# Altium integrated library vh_altium_library.intLib: 963 symbols (part 3 of 5)
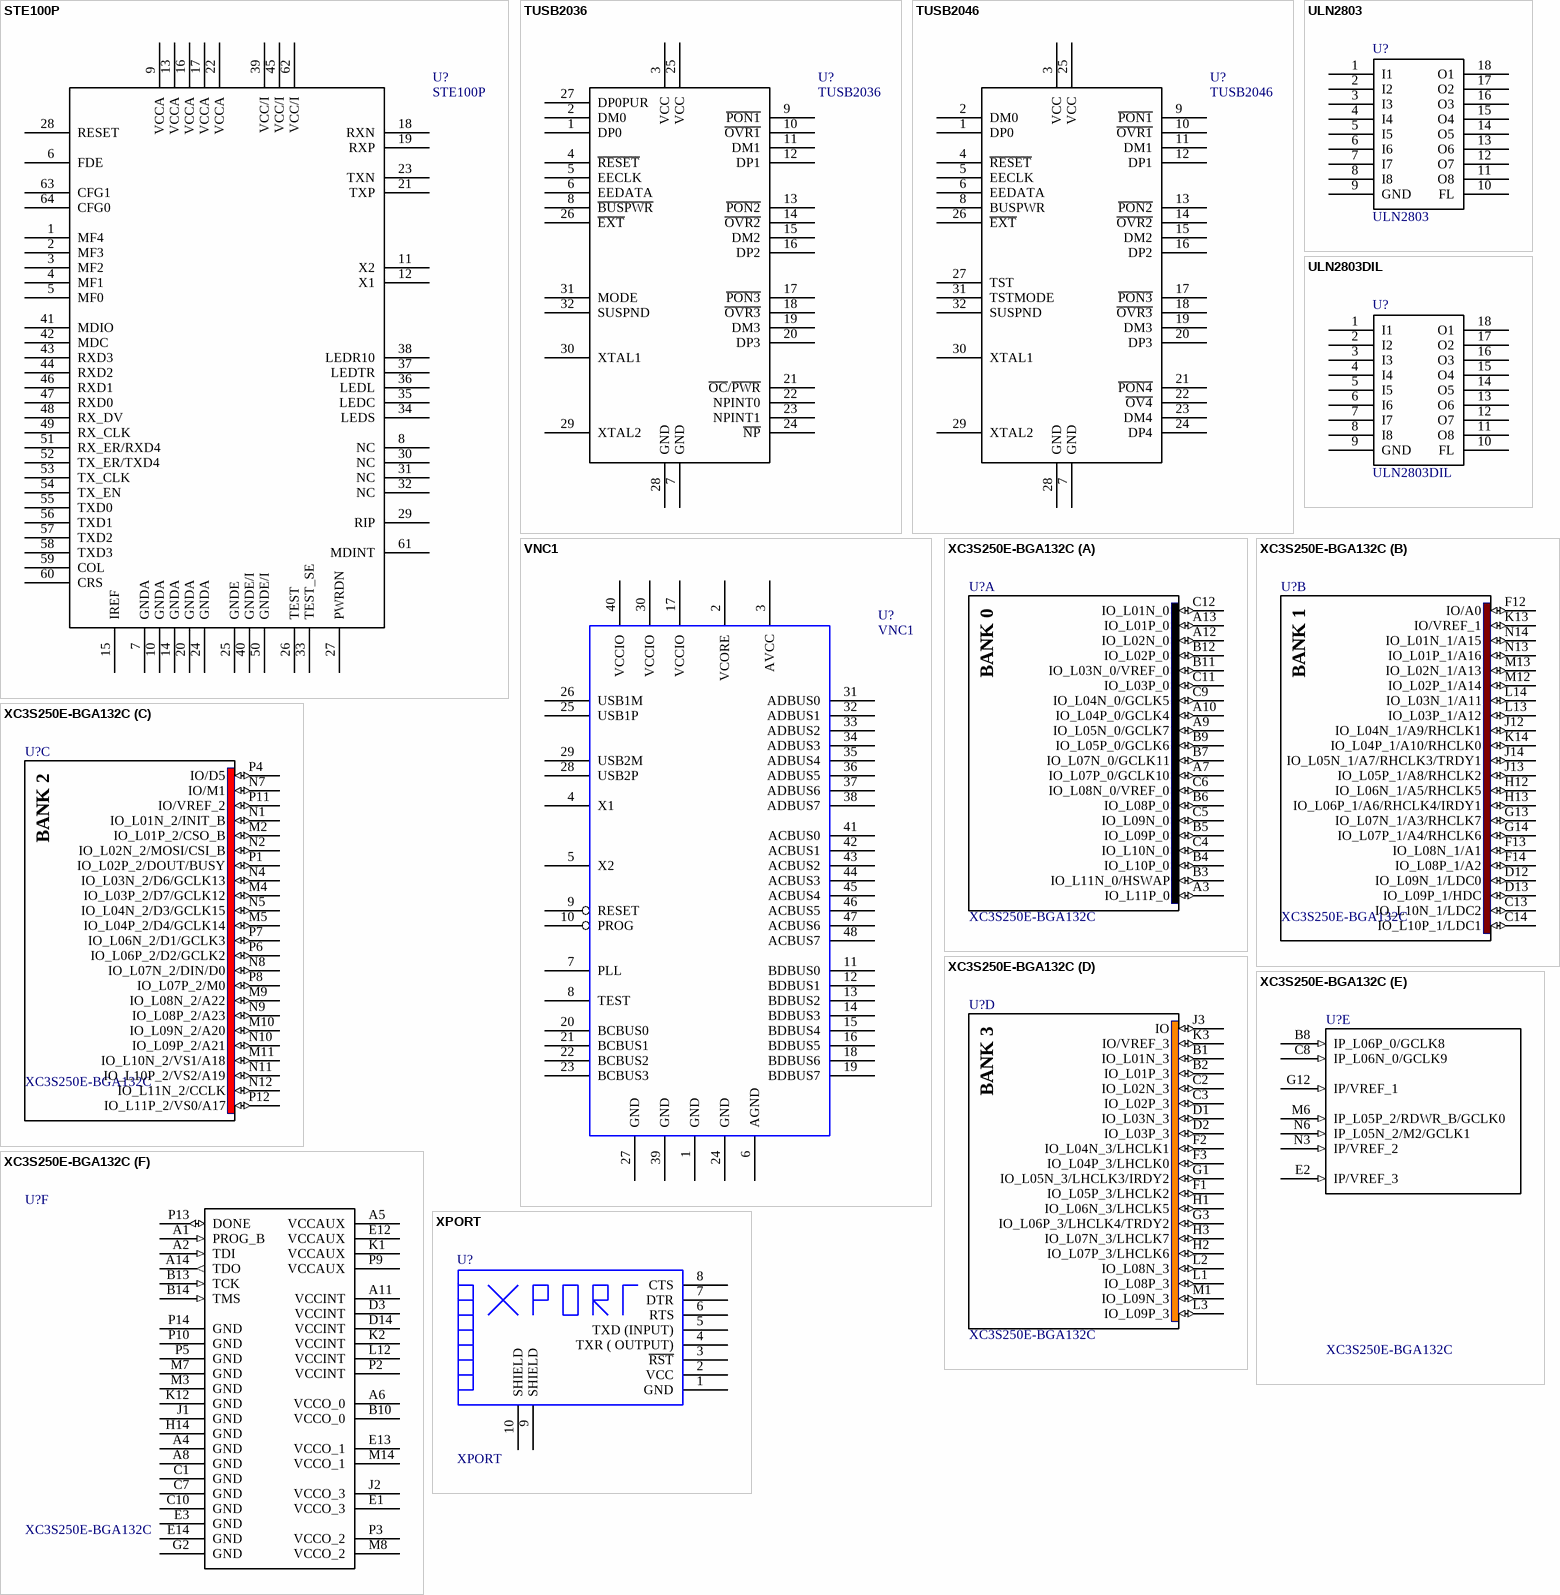
[diagram p70: symbols STE100P to XPORT]

## ULN2803
designator U?
OCTAL HIGH CURRENT DRIVER; Manufacturer: Texas Instruments; Manufacturer Part Number: ULN2803ADWR; Number of Drivers/Receivers: 8/0; Description: IC DARL TRANS ARRAY HV 18-SOIC; Voltage - Supply: 5V; Supplier 1: Digi-Key; Supplier Part Number 1: 296-15777-1-ND; Packaging: Cut Tape (CT); Supplier Part Number: 296-15777-1-ND; Type: Darlington Array; Supplier: Digi-Key; Protocol: -; Package / Case: 18-SOIC (7.5mm Width); Category: Integrated Circuits (ICs); RoHS: RoHS Compliant
footprint SO18W
pins: 1 I1, 2 I2, 3 I3, 4 I4, 5 I5, 6 I6, 7 I7, 8 I8, 9 GND, 10 FL, 11 O8, 12 O7, 13 O6, 14 O5, 15 O4, 16 O3, 17 O2, 18 O1

## ULN2803DIL
designator U?
OCTAL HIGH CURRENT DRIVER; Manufacturer: Texas Instruments; Manufacturer Part Number: ULN2803ADWR; Number of Drivers/Receivers: 8/0; Description: IC DARL TRANS ARRAY HV 18-SOIC; Voltage - Supply: 5V; Supplier 1: Digi-Key; Supplier Part Number 1: 296-15777-1-ND; Packaging: Cut Tape (CT); Supplier Part Number: 296-15777-1-ND; Type: Darlington Array; Supplier: Digi-Key; Protocol: -; Package / Case: 18-SOIC (7.5mm Width); Category: Integrated Circuits (ICs); RoHS: RoHS Compliant
footprint DIP18
pins: 1 I1, 2 I2, 3 I3, 4 I4, 5 I5, 6 I6, 7 I7, 8 I8, 9 GND, 10 FL, 11 O8, 12 O7, 13 O6, 14 O5, 15 O4, 16 O3, 17 O2, 18 O1

## VNC1
designator U?
VINCULUM USB HOST CONTROLLER; Manufacturer Part Number: VNC1L-1A-REEL; Manufacturer: FTDI, Future Technology Devices International Ltd; Description: IC USB HOST CTLR VINCULUM 48LQFP; Current - Supply: 25mA; Interface: SPI; Voltage - Supply: 3 V ~ 3.6 V; Controller Type: USB 2.0 Controller; Supplier 1: Digi-Key; Supplier Part Number 1: 768-1000-2-ND; Supplier Part Number: 768-1000-2-ND; RoHS: RoHS Compliant; Supplier: Digi-Key; Category: Integrated Circuits (ICs); Operating Temperature: 0°C ~ 70°C; Packaging: Tape & Reel (TR); Package / Case: 48-LQFP
footprint TQFP48
pins: 1 GND, 2 VCORE, 3 AVCC, 4 X1, 5 X2, 6 AGND, 7 PLL, 8 TEST, 9 RESET, 10 PROG, 11 BDBUS0, 12 BDBUS1, 13 BDBUS2, 14 BDBUS3, 15 BDBUS4, 16 BDBUS5, 17 VCCIO, 18 BDBUS6, 19 BDBUS7, 20 BCBUS0, 21 BCBUS1, 22 BCBUS2, 23 BCBUS3, 24 GND, 25 USB1P, 26 USB1M, 27 GND, 28 USB2P, 29 USB2M, 30 VCCIO, 31 ADBUS0, 32 ADBUS1, 33 ADBUS2, 34 ADBUS3, 35 ADBUS4, 36 ADBUS5, 37 ADBUS6, 38 ADBUS7, 39 GND, 40 VCCIO, 41 ACBUS0, 42 ACBUS1, 43 ACBUS2, 44 ACBUS3, 45 ACBUS4, 46 ACBUS5, 47 ACBUS6, 48 ACBUS7

## XC3S250E-BGA132C
designator U?
Spartan-3E 1.2V FPGA, 92 User I/Os, 132-Ball Chip-Scale BGA, Standard Performance, Commercial Grade, Pb-Free; FirstPublished: 6-Jun-2005; LatestRevisionDate: 30-Oct-2009; LatestRevisionNote: Updated to datasheet version 3.8 Aug-2009.; DatasheetVersion: ver3.8, Aug-2009; PackageVersion: ver1.3, Jun-2008; PackageReference: CPG132; Publisher: Altium Limited; PackageDescription: 132-Ball Chip Scale Ball Grid Array 0.5 mm Pitch (CPG132) - Pb-Free; Supplier 1: Digi-Key; Supplier Part Number 1: 122-1518-ND; ComponentLink1Description: Spartan-3E Datasheet; ComponentLink1URL: http://www.xilinx.com/support/documentation/data_sheets/ds312.pdf; ComponentLink2Description: CPG132 Package Drawing; ComponentLink2URL: http://www.xilinx.com/support/documentation/package_specs/cp132.pdf; ComponentLink3Description: Spartan-3E Documents; ComponentLink3URL: http://www.xilinx.com/support/documentation/spartan-3e.htm; ComponentLink4Description: Xilinx.com Home; ComponentLink4URL: http://www.xilinx.com
footprint CPG132 (BGA, 132-Leads, Body 8x8mm, Pitch 0.5mm)
part A pins: A3 IO_L11P_0 (io), A7 IO_L07P_0/GCLK10 (io), A9 IO_L05N_0/GCLK7 (io), A10 IO_L04P_0/GCLK4 (io), A12 IO_L02N_0 (io), A13 IO_L01P_0 (io), B3 IO_L11N_0/HSWAP (io), B4 IO_L10P_0 (io), B5 IO_L09P_0 (io), B6 IO_L08P_0 (io), B7 IO_L07N_0/GCLK11 (io), B9 IO_L05P_0/GCLK6 (io), B11 IO_L03N_0/VREF_0 (io), B12 IO_L02P_0 (io), C4 IO_L10N_0 (io), C5 IO_L09N_0 (io), C6 IO_L08N_0/VREF_0 (io), C9 IO_L04N_0/GCLK5 (io), C11 IO_L03P_0 (io), C12 IO_L01N_0 (io)
part B pins: C13 IO_L10N_1/LDC2 (io), C14 IO_L10P_1/LDC1 (io), D12 IO_L09N_1/LDC0 (io), D13 IO_L09P_1/HDC (io), F12 IO/A0 (io), F13 IO_L08N_1/A1 (io), F14 IO_L08P_1/A2 (io), G13 IO_L07N_1/A3/RHCLK7 (io), G14 IO_L07P_1/A4/RHCLK6 (io), H12 IO_L06N_1/A5/RHCLK5 (io), H13 IO_L06P_1/A6/RHCLK4/IRDY1 (io), J12 IO_L04N_1/A9/RHCLK1 (io), J13 IO_L05P_1/A8/RHCLK2 (io), J14 IO_L05N_1/A7/RHCLK3/TRDY1 (io), K13 IO/VREF_1 (io), K14 IO_L04P_1/A10/RHCLK0 (io), L13 IO_L03P_1/A12 (io), L14 IO_L03N_1/A11 (io), M12 IO_L02P_1/A14 (io), M13 IO_L02N_1/A13 (io), N13 IO_L01P_1/A16 (io), N14 IO_L01N_1/A15 (io)
part C pins: M2 IO_L01P_2/CSO_B (io), M4 IO_L03P_2/D7/GCLK12 (io), M5 IO_L04P_2/D4/GCLK14 (io), M9 IO_L08N_2/A22 (io), M10 IO_L09N_2/A20 (io), M11 IO_L10N_2/VS1/A18 (io), N1 IO_L01N_2/INIT_B (io), N2 IO_L02N_2/MOSI/CSI_B (io), N4 IO_L03N_2/D6/GCLK13 (io), N5 IO_L04N_2/D3/GCLK15 (io), N7 IO/M1 (io), N8 IO_L07N_2/DIN/D0 (io), N9 IO_L08P_2/A23 (io), N10 IO_L09P_2/A21 (io), N11 IO_L10P_2/VS2/A19 (io), N12 IO_L11N_2/CCLK (io), P1 IO_L02P_2/DOUT/BUSY (io), P4 IO/D5 (io), P6 IO_L06P_2/D2/GCLK2 (io), P7 IO_L06N_2/D1/GCLK3 (io), P8 IO_L07P_2/M0 (io), P11 IO/VREF_2 (io), P12 IO_L11P_2/VS0/A17 (io)
part D pins: B1 IO_L01N_3 (io), B2 IO_L01P_3 (io), C2 IO_L02N_3 (io), C3 IO_L02P_3 (io), D1 IO_L03N_3 (io), D2 IO_L03P_3 (io), F1 IO_L05P_3/LHCLK2 (io), F2 IO_L04N_3/LHCLK1 (io), F3 IO_L04P_3/LHCLK0 (io), G1 IO_L05N_3/LHCLK3/IRDY2 (io), G3 IO_L06P_3/LHCLK4/TRDY2 (io), H1 IO_L06N_3/LHCLK5 (io), H2 IO_L07P_3/LHCLK6 (io), H3 IO_L07N_3/LHCLK7 (io), J3 IO (io), K3 IO/VREF_3 (io), L1 IO_L08P_3 (io), L2 IO_L08N_3 (io), L3 IO_L09P_3 (io), M1 IO_L09N_3 (io)
part E pins: B8 IP_L06P_0/GCLK8 (in), C8 IP_L06N_0/GCLK9 (in), E2 IP/VREF_3 (in), G12 IP/VREF_1 (in), M6 IP_L05P_2/RDWR_B/GCLK0 (in), N3 IP/VREF_2 (in), N6 IP_L05N_2/M2/GCLK1 (in)
part F pins: A1 PROG_B (in), A2 TDI (in), A4 GND (power), A5 VCCAUX (power), A6 VCCO_0 (power), A8 GND (power), A11 VCCINT (power), A14 TDO (out), B10 VCCO_0 (power), B13 TCK (in), B14 TMS (in), C1 GND (power), C7 GND (power), C10 GND (power), D3 VCCINT (power), D14 VCCINT (power), E1 VCCO_3 (power), E3 GND (power), E12 VCCAUX (power), E13 VCCO_1 (power), E14 GND (power), G2 GND (power), H14 GND (power), J1 GND (power), J2 VCCO_3 (power), K1 VCCAUX (power), K2 VCCINT (power), K12 GND (power), L12 VCCINT (power), M3 GND (power), M7 GND (power), M8 VCCO_2 (power), M14 VCCO_1 (power), P2 VCCINT (power), P3 VCCO_2 (power), P5 GND (power), P9 VCCAUX (power), P10 GND (power), P13 DONE (io), P14 GND (power)
part A text: BANK 0
part B text: BANK 1
part C text: BANK 2
part D text: BANK 3

## XPORT
designator U?
XPORT ETHERNET INTERFACE
footprint XPORT
pins: 1 GND, 2 VCC, 3 ~{RST}, 4 TXR ( OUTPUT), 5 TXD (INPUT), 6 RTS, 7 DTR, 8 CTS, 9 SHIELD, 10 SHIELD


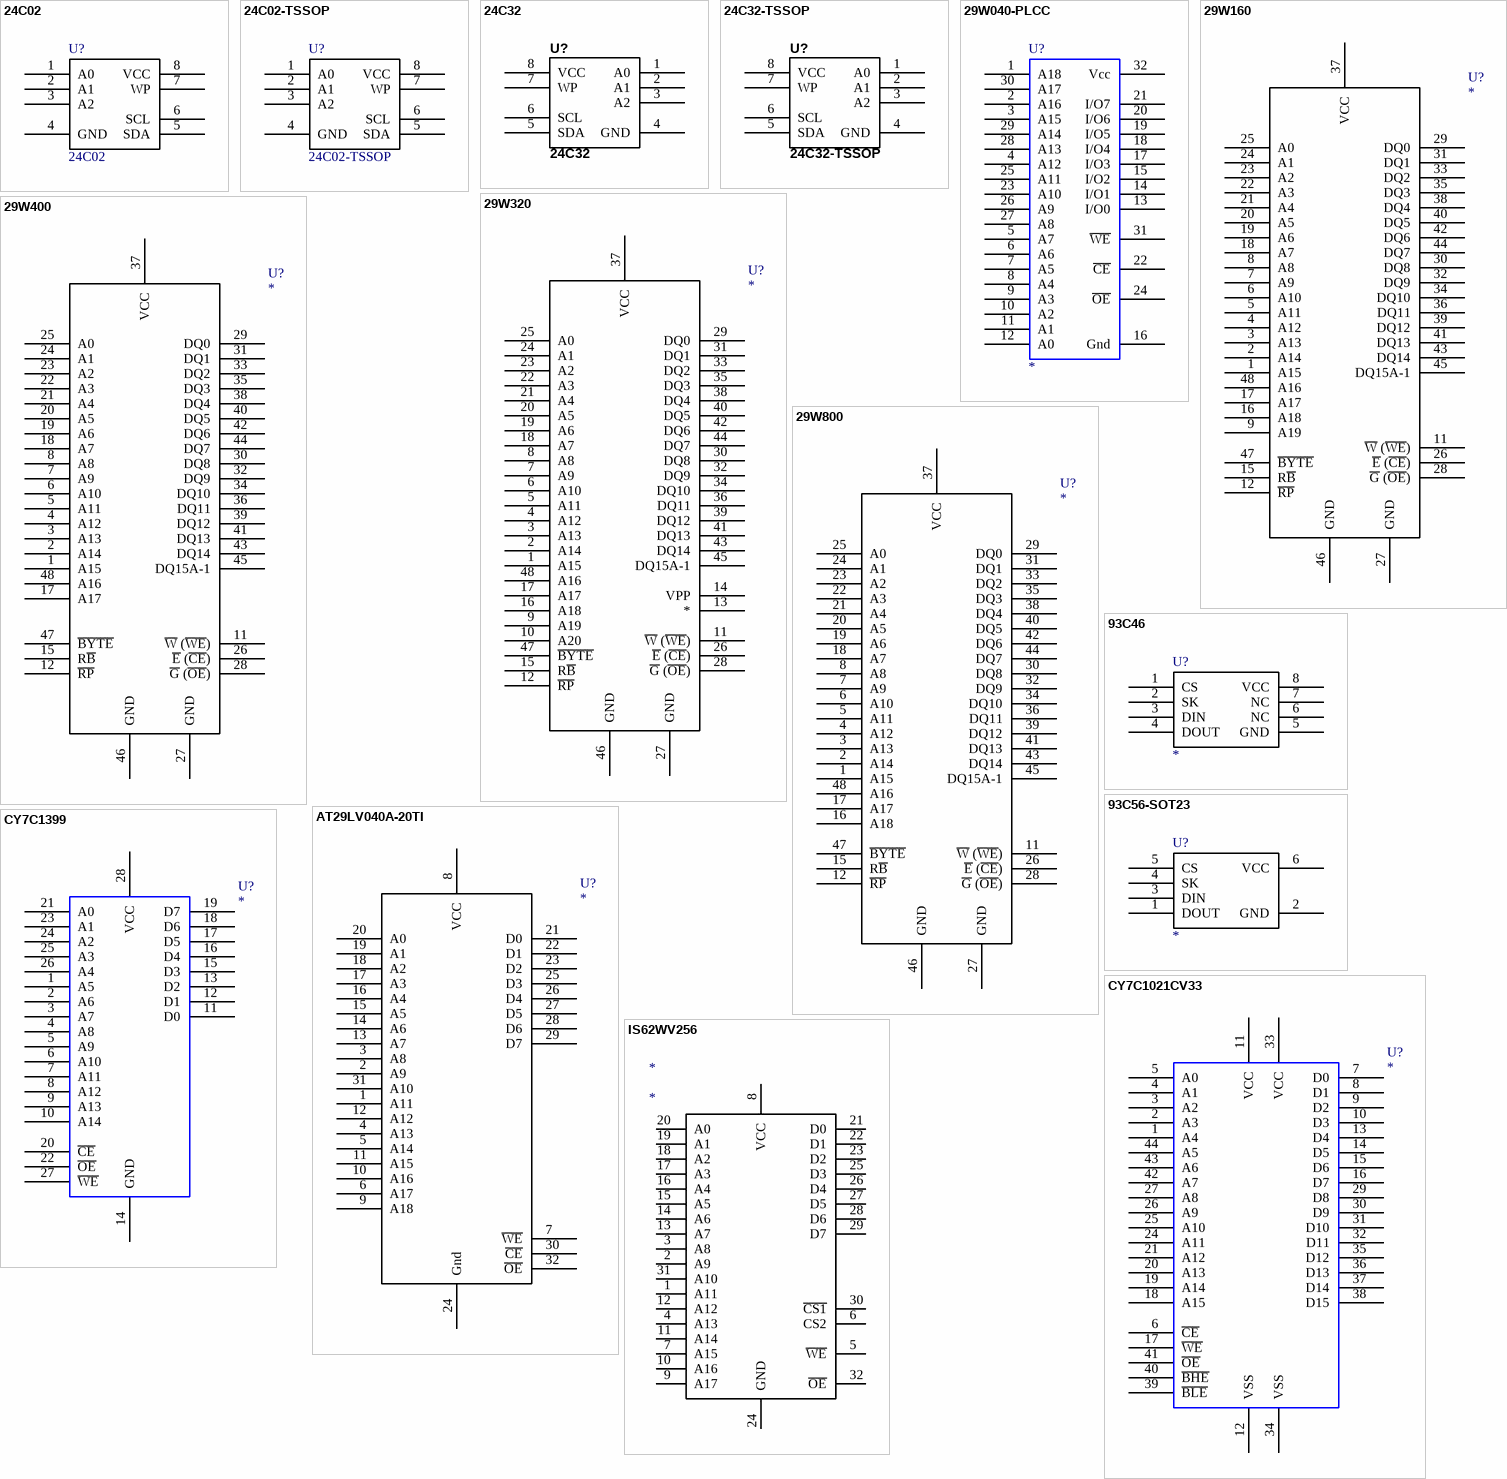
[diagram p28: symbols 24C02 to IS62WV256]

## 24C02
designator U?
I2C EEPROM 256b X 8
footprint SO8
pins: 1 A0, 2 A1, 3 A2, 4 GND, 5 SDA, 6 SCL, 7 WP, 8 VCC

## 24C02-TSSOP
designator U?
I2C EEPROM 256b X 8; Supplier 1: Digi-Key; Supplier Part Number 1: 497-4926-1-ND
footprint TSSOP8
pins: 1 A0, 2 A1, 3 A2, 4 GND, 5 SDA, 6 SCL, 7 WP, 8 VCC

## 24C32
designator U?
I2C EEPROM 4K X 8; Part Field 1: STM; Manufacturer Part Number: M24C32-WMN6TP; Manufacturer: STMicroelectronics; Description: IC EEPROM 32KBIT 400KHZ 8SOIC; Reel: U3; Part Field 2: M24C32-WMN6TP; Part Field 3: Digi-Key; Part Field 4: 497-5027-6-ND; Part Field 5: SERIAL I2C EEPROM; Supplier 1: Digi-Key; Supplier Part Number 1: 497-5027-2-ND
footprint SO8
pins: 1 A0, 2 A1, 3 A2, 4 GND, 5 SDA, 6 SCL, 7 WP, 8 VCC

## 24C32-TSSOP
designator U?
I2C EEPROM 4K X 8; Part Field 1: STM; Manufacturer Part Number: M24C32-WMN6TP; Manufacturer: STMicroelectronics; Description: IC EEPROM 32KBIT 400KHZ 8SOIC; Reel: U3; Part Field 2: M24C32-WMN6TP; Part Field 3: Digi-Key; Part Field 4: 497-5027-6-ND; Part Field 5: SERIAL I2C EEPROM; Supplier 1: Digi-Key; Supplier Part Number 1: 497-8642-1-ND
footprint SO8
pins: 1 A0, 2 A1, 3 A2, 4 GND, 5 SDA, 6 SCL, 7 WP, 8 VCC

## 29W040-PLCC
designator U?
FLASH 512K x 8 PLCC32; Text Field1: Atmel; Text Field2: AT29LV040-20TC; Text Field3: Avnet; Text Field4: AT29LV040-20TC
footprint PLCC32
footprint PLCC32S
pins: 1 A18, 2 A16, 3 A15, 4 A12, 5 A7, 6 A6, 7 A5, 8 A4, 9 A3, 10 A2, 11 A1, 12 A0, 13 I/O0, 14 I/O1, 15 I/O2, 16 Gnd, 17 I/O3, 18 I/O4, 19 I/O5, 20 I/O6, 21 I/O7, 22 ~{CE}, 23 A10, 24 ~{OE}, 25 A11, 26 A9, 27 A8, 28 A13, 29 A14, 30 A17, 31 ~{WE}, 32 Vcc

## 29W160
designator U?
16MBIT FLASH; Text Field1: ST; Text Field2: M29W160DB90N1; Text Field3: Avnet; Text Field5: TSOP48; Text Field6: 2.97; Text Field4: M29W160DB90N1; NI?: *; O?: *; Section:: *
footprint TSOP48
pins: 1 A15, 2 A14, 3 A13, 4 A12, 5 A11, 6 A10, 7 A9, 8 A8, 9 A19, 11 ~{W} (~{WE}), 12 ~{RP}, 15 R~{B}, 16 A18, 17 A17, 18 A7, 19 A6, 20 A5, 21 A4, 22 A3, 23 A2, 24 A1, 25 A0, 26 ~{E} (~{CE}), 27 GND, 28 ~{G} (~{OE}), 29 DQ0, 30 DQ8, 31 DQ1, 32 DQ9, 33 DQ2, 34 DQ10, 35 DQ3, 36 DQ11, 37 VCC, 38 DQ4, 39 DQ12, 40 DQ5, 41 DQ13, 42 DQ6, 43 DQ14, 44 DQ7, 45 DQ15A-1, 46 GND, 47 ~{BYTE}, 48 A16

## 29W320
designator U?
32 MBIT FLASH; Text Field1: ST; Text Field2: M29W160DB90N1; Text Field3: Avnet; Text Field5: TSOP48; Text Field6: 2.97; Text Field4: M29W160DB90N1; NI?: *; O?: *; Section:: *
footprint TSOP48
pins: 1 A15, 2 A14, 3 A13, 4 A12, 5 A11, 6 A10, 7 A9, 8 A8, 9 A19, 10 A20, 11 ~{W} (~{WE}), 12 ~{RP}, 13 *, 14 VPP, 15 R~{B}, 16 A18, 17 A17, 18 A7, 19 A6, 20 A5, 21 A4, 22 A3, 23 A2, 24 A1, 25 A0, 26 ~{E} (~{CE}), 27 GND, 28 ~{G} (~{OE}), 29 DQ0, 30 DQ8, 31 DQ1, 32 DQ9, 33 DQ2, 34 DQ10, 35 DQ3, 36 DQ11, 37 VCC, 38 DQ4, 39 DQ12, 40 DQ5, 41 DQ13, 42 DQ6, 43 DQ14, 44 DQ7, 45 DQ15A-1, 46 GND, 47 ~{BYTE}, 48 A16

## 29W400
designator U?
4MBIT FLASH; Text Field1: ST; Text Field2: M29W160DB90N1; Text Field3: Avnet; Text Field5: TSOP48; Text Field6: 2.97; Text Field4: M29W160DB90N1; NI?: *; O?: *; Section:: *
footprint TSOP48
pins: 1 A15, 2 A14, 3 A13, 4 A12, 5 A11, 6 A10, 7 A9, 8 A8, 11 ~{W} (~{WE}), 12 ~{RP}, 15 R~{B}, 17 A17, 18 A7, 19 A6, 20 A5, 21 A4, 22 A3, 23 A2, 24 A1, 25 A0, 26 ~{E} (~{CE}), 27 GND, 28 ~{G} (~{OE}), 29 DQ0, 30 DQ8, 31 DQ1, 32 DQ9, 33 DQ2, 34 DQ10, 35 DQ3, 36 DQ11, 37 VCC, 38 DQ4, 39 DQ12, 40 DQ5, 41 DQ13, 42 DQ6, 43 DQ14, 44 DQ7, 45 DQ15A-1, 46 GND, 47 ~{BYTE}, 48 A16

## 29W800
designator U?
8MBIT FLASH; Text Field1: ST; Text Field2: M29W160DB90N1; Text Field3: Avnet; Text Field5: TSOP48; Text Field6: 2.97; Text Field4: M29W160DB90N1; NI?: *; O?: *; Section:: *
footprint TSOP48
pins: 1 A15, 2 A14, 3 A13, 4 A12, 5 A11, 6 A10, 7 A9, 8 A8, 11 ~{W} (~{WE}), 12 ~{RP}, 15 R~{B}, 16 A18, 17 A17, 18 A7, 19 A6, 20 A5, 21 A4, 22 A3, 23 A2, 24 A1, 25 A0, 26 ~{E} (~{CE}), 27 GND, 28 ~{G} (~{OE}), 29 DQ0, 30 DQ8, 31 DQ1, 32 DQ9, 33 DQ2, 34 DQ10, 35 DQ3, 36 DQ11, 37 VCC, 38 DQ4, 39 DQ12, 40 DQ5, 41 DQ13, 42 DQ6, 43 DQ14, 44 DQ7, 45 DQ15A-1, 46 GND, 47 ~{BYTE}, 48 A16

## 93C46
designator U?
MICROWIRE EEPROM
footprint SO8
pins: 1 CS, 2 SK, 3 DIN, 4 DOUT, 5 GND, 6 NC, 7 NC, 8 VCC

## 93C56-SOT23
designator U?
MICROWIRE EEPROM
footprint SOT23-6
pins: 1 DOUT, 2 GND, 3 DIN, 4 SK, 5 CS, 6 VCC

## AT29LV040A-20TI
designator U?
IC 512K x 8 Flash Memory TSOP-32; Text Field1: Atmel; Text Field2: AT29LV040-20TC; Text Field3: Avnet; Text Field4: AT29LV040-20TC
footprint AT29LV040A-20TI
pins: 1 A11, 2 A9, 3 A8, 4 A13, 5 A14, 6 A17, 7 ~{WE}, 8 VCC, 9 A18, 10 A16, 11 A15, 12 A12, 13 A7, 14 A6, 15 A5, 16 A4, 17 A3, 18 A2, 19 A1, 20 A0, 21 D0, 22 D1, 23 D2, 24 Gnd, 25 D3, 26 D4, 27 D5, 28 D6, 29 D7, 30 ~{CE}, 31 A10, 32 ~{OE}

## CY7C1021CV33
designator U?
STATIC RAM
footprint TSOP44
pins: 1 A4, 2 A3, 3 A2, 4 A1, 5 A0, 6 ~{CE}, 7 D0, 8 D1, 9 D2, 10 D3, 11 VCC, 12 VSS, 13 D4, 14 D5, 15 D6, 16 D7, 17 ~{WE}, 18 A15, 19 A14, 20 A13, 21 A12, 24 A11, 25 A10, 26 A9, 27 A8, 29 D8, 30 D9, 31 D10, 32 D11, 33 VCC, 34 VSS, 35 D12, 36 D13, 37 D14, 38 D15, 39 ~{BLE}, 40 ~{BHE}, 41 ~{OE}, 42 A7, 43 A6, 44 A5

## CY7C1399
designator U?
32K ASYNCHRONOUS SRAM
footprint SOJ28
pins: 1 A5, 2 A6, 3 A7, 4 A8, 5 A9, 6 A10, 7 A11, 8 A12, 9 A13, 10 A14, 11 D0, 12 D1, 13 D2, 14 GND, 15 D3, 16 D4, 17 D5, 18 D6, 19 D7, 20 ~{CE}, 21 A0, 22 ~{OE}, 23 A1, 24 A2, 25 A3, 26 A4, 27 ~{WE}, 28 VCC

## IS62WV256
designator *
footprint TSOP32 (TSSOP, 32-Leads, Body 8.1x18.5mm (max), Pitch 0.50mm, IPC Medium Density)
pins: 1 A11, 2 A9, 3 A8, 4 A13, 5 ~{WE}, 6 CS2, 7 A15, 8 VCC, 9 A17, 10 A16, 11 A14, 12 A12, 13 A7, 14 A6, 15 A5, 16 A4, 17 A3, 18 A2, 19 A1, 20 A0, 21 D0, 22 D1, 23 D2, 24 GND, 25 D3, 26 D4, 27 D5, 28 D6, 29 D7, 30 ~{CS1}, 31 A10, 32 ~{OE}

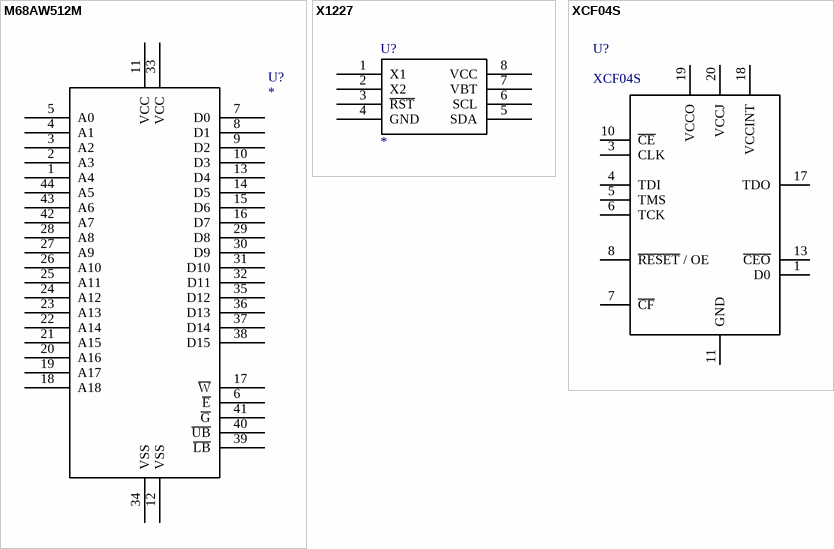
[diagram p29: symbols M68AW512M to XCF04S]

## M68AW512M
designator U?
512K X 16 ASYNCHRONUS SRAM ST MICROELECTRONICS
footprint TSOP44
pins: 1 A4, 2 A3, 3 A2, 4 A1, 5 A0, 6 ~{E}, 7 D0, 8 D1, 9 D2, 10 D3, 11 VCC, 12 VSS, 13 D4, 14 D5, 15 D6, 16 D7, 17 ~{W}, 18 A18, 19 A17, 20 A16, 21 A15, 22 A14, 23 A13, 24 A12, 25 A11, 26 A10, 27 A9, 28 A8, 29 D8, 30 D9, 31 D10, 32 D11, 33 VCC, 34 VSS, 35 D12, 36 D13, 37 D14, 38 D15, 39 ~{LB}, 40 ~{UB}, 41 ~{G}, 42 A7, 43 A6, 44 A5

## X1227
designator U?
REALTIME CLOCK WITH 4KBIT EEPROM  XICOR
footprint SO8
pins: 1 X1, 2 X2, 3 ~{RST}, 4 GND, 5 SDA, 6 SCL, 7 VBT, 8 VCC

## XCF04S
designator U?
XILINX CONFIGURATION ROM; Supplier 1: Digi-Key; Supplier Part Number 1: 122-1288-5-ND
footprint TSSOP20
pins: 1 D0, 3 CLK, 4 TDI, 5 TMS, 6 TCK, 7 ~{CF}, 8 ~{RESET} / OE, 10 ~{CE}, 11 GND, 13 ~{CEO}, 17 TDO, 18 VCCINT, 19 VCCO, 20 VCCJ


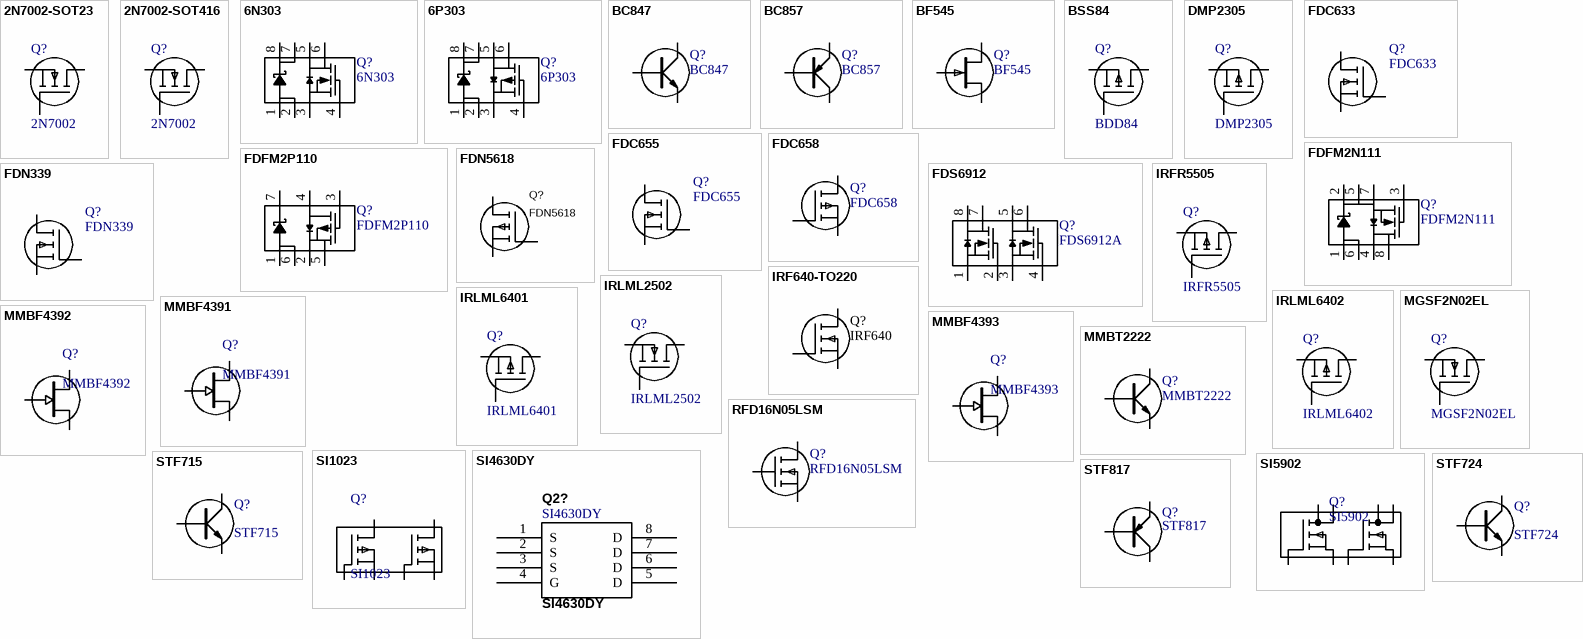
[diagram p30: symbols 2N7002-SOT23 to STF817]

## 2N7002-SOT23
designator Q?, comment 2N7002
N CHANNEL MOSFET 2N7002 SOT23; Manufacturer: Fairchild Semiconductor; Drain to Source Voltage (Vdss): 60V; Vgs(th) (Max) @ Id: 2.5V @ 250µA; Power - Max: 200mW; Current - Continuous Drain (Id) @ 25° C: 115mA; Rds On (Max) @ Id, Vgs: 7.5 Ohm @ 500mA, 10V; FET Type: MOSFET N-Channel, Metal Oxide; FET Feature: Logic Level Gate; Input Capacitance (Ciss) @ Vds: 50pF @ 25V; Description: MOSFET N-CH 60V 115MA SOT-23; Reel: Q2; Supplier 1: Digi-Key; Supplier Part Number 1: 2N7002NTR-ND; Package / Case: SOT-23-3, TO-236-3, Micro3™, SSD3, SST3; RoHS: RoHS Compliant; Mounting Type: Surface Mount; Packaging: Tape & Reel (TR); Gate Charge (Qg) @ Vgs: -; Supplier Part Number: 2N7002NTR-ND; Supplier: Digi-Key; Category: Discrete Semiconductor Products; Manufacturer Part Number: 2N7002
footprint SOT23-GDS
pins: D, G, S

## 2N7002-SOT416
designator Q?, comment 2N7002
N CHANNEL MOSFET 2N7002 SOT416; Manufacturer Part Number: NTA7002NT1G; Manufacturer: ON Semiconductor; Description: MOSFET N-CH 30V 154MA SOT-416; Reel: Q6; Supplier 1: Digi-Key; Supplier Part Number 1: NTA7002NT1GOSTR-ND
footprint SOT416-GDS (SOT416 GDS)
pins: D, G, S

## 6N303
designator Q?
NMOS with Shottky diode in MicroFET 3x3mm; Supplier 1: Digi-Key; Supplier Part Number 1: NTMSD6N303R2GOS-ND
footprint SO8
pins: 1, 2, 3, 4, 5, 6, 7, 8

## 6P303
designator Q?
NMOS with Shottky diode in MicroFET 3x3mm
footprint SO8
pins: 1, 2, 3, 4, 5, 6, 7, 8

## BC847
designator Q?
BC847 SMALL SIGNAL NPN TRANSISTOR; Manufacturer Part Number: BC847BMTF; Manufacturer: Fairchild Semiconductor; Current - Collector (Ic) (Max): 100mA; Frequency - Transition: 300MHz; Vce Saturation (Max) @ Ib, Ic: 200mV @ 5mA, 100mA; Voltage - Collector Emitter Breakdown (Max): 45V; Power - Max: 310mW; DC Current Gain (hFE) (Min) @ Ic, Vce: 200 @ 2mA, 5V; Description: TRANSISTOR NPN 45V 0.1A SOT23; Supplier 1: Digi-Key; Supplier Part Number 1: BC847BMTFCT-ND; RoHS: RoHS Compliant; Transistor Type: NPN; Mounting Type: Surface Mount; Packaging: Cut Tape (CT); Package / Case: SOT-23-3, TO-236-3, Micro3™, SSD3, SST3; Current - Collector Cutoff (Max): -; Supplier: Digi-Key; Category: Discrete Semiconductor Products; Supplier Part Number: BC847BMTFCT-ND
footprint SOT23-BCE
pins: B, C, E

## BC857
designator Q?
BC857 SMALL SIGNAL PNP BIPOLAR TRANSISTOR; Manufacturer: Diodes Inc; Manufacturer Part Number: BC857C-7-F; Vce Saturation (Max) @ Ib, Ic: 650mV @ 5mA, 100mA; Current - Collector (Ic) (Max): 100mA; Voltage - Collector Emitter Breakdown (Max): 45V; Frequency - Transition: 200MHz; Power - Max: 300mW; DC Current Gain (hFE) (Min) @ Ic, Vce: 420 @ 2mA, 5V; Current - Collector Cutoff (Max): 15nA; Description: TRANS PNP BIPOLAR 45V SOT23-3; Supplier 1: Digi-Key; Supplier Part Number 1: BC857C-FDICT-ND; Mounting Type: Surface Mount; Packaging: Cut Tape (CT); Package / Case: SOT-23-3, TO-236-3, Micro3™, SSD3, SST3; Transistor Type: PNP; RoHS: RoHS Compliant; Supplier: Digi-Key; Supplier Part Number: BC857C-FDICT-ND; Category: Discrete Semiconductor Products
footprint SOT23-BCE
pins: B, C, E

## BF545
designator Q?
BF545 SMALL SIGNAL JFET; Manufacturer Part Number: BF545C,215; Manufacturer: NXP Semiconductors; Description: JFET N-CHAN 30V SOT-23; Voltage - Rated: 30V; Transistor Type: N-Channel JFET; Current Rating: 25mA; Supplier 1: Digi-Key; Supplier Part Number 1: 568-1966-2-ND; Packaging: Tape & Reel (TR); Voltage - Test: -; Package / Case: SST3 (SOT-23-3); Power - Output: -; Supplier Part Number: 568-1966-2-ND; RoHS: RoHS Compliant; Noise Figure: -; Supplier: Digi-Key; Gain: -; Current - Test: -; Frequency: -; Category: Discrete Semiconductor Products
footprint SOT23-GDS
pins: D, G, S

## BSS84
designator Q?, comment BDD84
P CHANNEL MOSFET; Manufacturer: Infineon Technologies; Manufacturer Part Number: BSS84P L6327; Reel: Q11; Input Capacitance (Ciss) @ Vds: 19pF @ 25V; Current - Continuous Drain (Id) @ 25° C: 170mA; Vgs(th) (Max) @ Id: 2V @ 20µA; Description: MOSFET P-CH 60V 170MA SOT-23; FET Feature: Logic Level Gate; FET Type: MOSFET P-Channel, Metal Oxide; Power - Max: 360mW; Gate Charge (Qg) @ Vgs: 1.5nC @ 10V; Drain to Source Voltage (Vdss): 60V; Rds On (Max) @ Id, Vgs: 8 Ohm @ 170mA, 10V; Supplier 1: Digi-Key; Supplier: Digi-Key; Packaging: Tape & Reel (TR); RoHS: RoHS Compliant; Category: Discrete Semiconductor Products; Package / Case: SOT-23; Mounting Type: Surface Mount; Supplier Part Number 1: BSS84PL6327INTR-ND; Supplier Part Number: BSS84PL6327INTR-ND
footprint SOT23-GDS
pins: D, G, S

## DMP2305
designator Q?
P CHANNEL MOSFET; Manufacturer Part Number: DMP2305U-7; Manufacturer: Diodes Inc; Input Capacitance (Ciss) @ Vds: 727pF @ 20V; Description: MOSFET P-CH 20V 4.2A SOT-23; Gate Charge (Qg) @ Vgs: 7.6nC @ 4.5V; FET Type: MOSFET P-Channel, Metal Oxide; Rds On (Max) @ Id, Vgs: 60 mOhm @ 4.2A, 4.5V; Drain to Source Voltage (Vdss): 20V; Vgs(th) (Max) @ Id: 900mV @ 250µA; Power - Max: 1.4W; Current - Continuous Drain (Id) @ 25° C: 4.2A; FET Feature: Logic Level Gate; Supplier 1: Digi-Key; Packaging: Tape & Reel (TR); RoHS: RoHS Compliant; Supplier: Digi-Key; Mounting Type: Surface Mount; Category: Discrete Semiconductor Products; Package / Case: SOT-23; Supplier Part Number 1: DMP2305UDITR-ND; Supplier Part Number: DMP2305UDITR-ND
footprint SOT23-GDS
pins: D, G, S

## FDC633
designator Q?
N CHANNEL MOSFET; Manufacturer: Fairchild Semiconductor; Manufacturer Part Number: FDC6333C; Power - Max: 700mW; Vgs(th) (Max) @ Id: 3V @ 250µA; Drain to Source Voltage (Vdss): 30V; Current - Continuous Drain (Id) @ 25° C: 2.5A, 2A; Input Capacitance (Ciss) @ Vds: 282pF @ 15V; Gate Charge (Qg) @ Vgs: 6.6nC @ 10V; FET Type: N and P-Channel; Description: MOSFET N-CH/P-CHAN 30V SSOT6; Rds On (Max) @ Id, Vgs: 95 mOhm @ 2.5A, 10V; FET Feature: Logic Level Gate; Supplier 1: Digi-Key; Supplier Part Number 1: FDC6333CTR-ND; Package / Case: 6-SSOT, SuperSOT-6; Packaging: Tape & Reel (TR); Mounting Type: Surface Mount; Category: Discrete Semiconductor Products; Supplier: Digi-Key; RoHS: RoHS Compliant; Supplier Part Number: FDC6333CTR-ND
footprint SOT23-6
pins: 1, 2, 3, 4, 5, 6

## FDC655
designator Q?
N CHANNEL MOSFET; Manufacturer Part Number: FDC655BN; Manufacturer: Fairchild Semiconductor; Description: MOSFET N-CH 30V 6.3A SSOT-6; Drain to Source Voltage (Vdss): 30V; FET Type: MOSFET N-Channel, Metal Oxide; Power - Max: 800mW; Input Capacitance (Ciss) @ Vds: 570pF @ 15V; Gate Charge (Qg) @ Vgs: 15nC @ 10V; Current - Continuous Drain (Id) @ 25° C: 6.3A; Vgs(th) (Max) @ Id: 3V @ 250µA; FET Feature: Logic Level Gate; Rds On (Max) @ Id, Vgs: 25 mOhm @ 6.3A, 10V; Reel: Q12; Supplier 1: Digi-Key; Supplier Part Number 1: FDC655BNCT-ND; Category: Discrete Semiconductor Products; Supplier Part Number: FDC655BNCT-ND; Packaging: Cut Tape (CT); Mounting Type: Surface Mount; RoHS: RoHS Compliant; Supplier: Digi-Key; Package / Case: 6-SSOT, SuperSOT-6
footprint SOT23-6
pins: 1, 2, 3, 4, 5, 6

## FDC658
designator Q?
P-CHANNEL MOSFET; Manufacturer Part Number: FDC658AP; Manufacturer: Fairchild Optoelectronics Group; FET Feature: Logic Level Gate; Input Capacitance (Ciss) @ Vds: 470pF @ 15V; Vgs(th) (Max) @ Id: 3V @ 250µA; Current - Continuous Drain (Id) @ 25° C: 4A; Rds On (Max) @ Id, Vgs: 50 mOhm @ 4A, 10V; Description: MOSFET P-CH SGL LL 30V 4A SSOT6; Power - Max: 800mW; FET Type: MOSFET P-Channel, Metal Oxide; Gate Charge (Qg) @ Vgs: 8.1nC @ 5V; Drain to Source Voltage (Vdss): 30V; Reel: Q14; Supplier 1: Digi-Key; Supplier Part Number 1: FDC658APDKR-ND; Packaging: Digi-Reel®; Mounting Type: Surface Mount; Category: Discrete Semiconductor Products; Supplier Part Number: FDC658APDKR-ND; RoHS: RoHS Compliant; Supplier: Digi-Key; Package / Case: SuperSOT-6
footprint SOT23-6
pins: 1, 2, 3, 4, 5, 6

## FDFM2N111
designator Q?
NMOS with Shottky diode in MicroFET 3x3mm; Manufacturer: Fairchild Semiconductor; FET Type: MOSFET N-Channel, Metal Oxide; Rds On (Max) @ Id, Vgs: 100 mOhm @ 4A, 4.5V; Gate Charge (Qg) @ Vgs: 3.8nC @ 4.5V; Description: MOSFET N-CH 20V 4A 3X3 MLP; Drain to Source Voltage (Vdss): 20V; Vgs(th) (Max) @ Id: 1.5V @ 250µA; FET Feature: Diode (Isolated); Current - Continuous Drain (Id) @ 25° C: 4A; Input Capacitance (Ciss) @ Vds: 273pF @ 10V; Power - Max: 800mW; Supplier 1: Digi-Key; Supplier Part Number 1: FDFM2N111-ND; Category: Discrete Semiconductor Products; Supplier: Digi-Key; Package / Case: 6-MLP, Power33; Supplier Part Number: FDFM2N111-ND; Packaging: Tape & Reel (TR); Mounting Type: Surface Mount; Manufacturer Part Number: FDFM2N111; RoHS: RoHS Compliant
pins: 1 A, 2 A, 3 S, 4 G, 5 D, 6 D, 7 C, 8 C

## FDFM2P110
designator Q?
PMOS with Shottky diode in MicroFET 3x3mm; Manufacturer: Fairchild Semiconductor; Description: MOSFET P-CH 20V 3.5A 3X3 MLP; Current - Continuous Drain (Id) @ 25° C: 3.5A; Rds On (Max) @ Id, Vgs: 140 mOhm @ 3.5A, 4.5V; Gate Charge (Qg) @ Vgs: 4nC @ 4.5V; FET Feature: Diode (Isolated); Power - Max: 800mW; Drain to Source Voltage (Vdss): 20V; Vgs(th) (Max) @ Id: 1.5V @ 250µA; Input Capacitance (Ciss) @ Vds: 280pF @ 10V; FET Type: MOSFET P-Channel, Metal Oxide; Supplier 1: Digi-Key; Supplier Part Number 1: FDFM2P110-ND; RoHS: RoHS Compliant; Package / Case: 6-MLP, Power33; Supplier: Digi-Key; Mounting Type: Surface Mount; Manufacturer Part Number: FDFM2P110; Supplier Part Number: FDFM2P110-ND; Category: Discrete Semiconductor Products; Packaging: Tape & Reel (TR)
pins: 1 A, 2 A, 3 S, 4 G, 5 D, 6 D, 7 C

## FDN339
designator Q?
N-MOS TRANSISTOR FDN339; Manufacturer: Fairchild Semiconductor; Manufacturer Part Number: FDN339AN; Power - Max: 460mW; Rds On (Max) @ Id, Vgs: 35 mOhm @ 3A, 4.5V; Description: MOSFET N-CH 20V 3A SSOT3; FET Type: MOSFET N-Channel, Metal Oxide; Vgs(th) (Max) @ Id: 1.5V @ 250µA; FET Feature: Logic Level Gate; Input Capacitance (Ciss) @ Vds: 700pF @ 10V; Current - Continuous Drain (Id) @ 25° C: 3A; Drain to Source Voltage (Vdss): 20V; Gate Charge (Qg) @ Vgs: 10nC @ 4.5V; Reel: Q4; Supplier 1: Digi-Key; Supplier Part Number 1: FDN339ANTR-ND; Mounting Type: Surface Mount; RoHS: RoHS Compliant; Packaging: Tape & Reel (TR); Supplier: Digi-Key; Supplier Part Number: FDN339ANTR-ND; Package / Case: 3-SSOT, SuperSOT-3; Category: Discrete Semiconductor Products
footprint SOT23-GDS
pins: D, G, S
